# Altium footprint library LTM-2405.PcbLib: 22 footprints (part 2 of 2)
Each footprint in its own frame and in the unit in brackets; x right, y up, seen from the top. Pads: shape width x height; smd on the part's side, far side on the other; paste and mask are expansions set on the pad; w line width, h text height; cw(c..) or ccw(c..) is an arc to the next point about the centre after c.
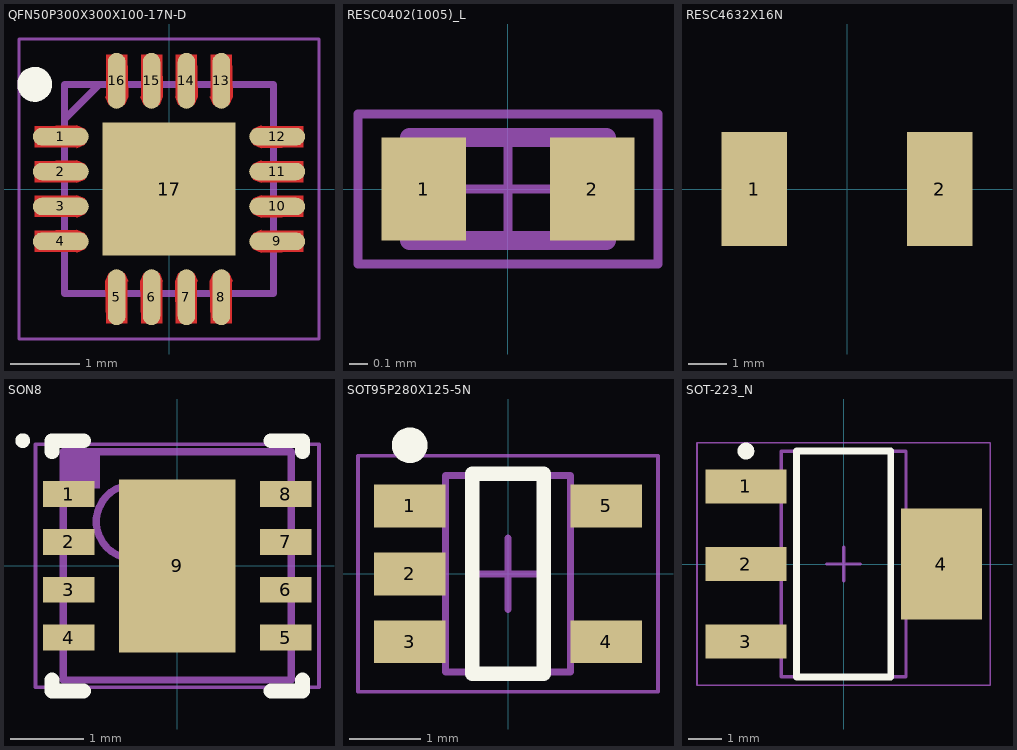
[diagram p1: the footprints below, top view; thin cyan lines are the x and y axes]

## QFN50P300X300X100-17N-D [mm]
pads (17):
  oval 0.8x0.25 smd: 1(-1.55,0.75) 2(-1.55,0.25) 3(-1.55,-0.25) 4(-1.55,-0.75) 9(1.55,-0.75) 10(1.55,-0.25) 11(1.55,0.25) 12(1.55,0.75)
  oval 0.25x0.8 smd: 5(-0.75,-1.55) 6(-0.25,-1.55) 7(0.25,-1.55) 8(0.75,-1.55) 13(0.75,1.55) 14(0.25,1.55) 15(-0.25,1.55) 16(-0.75,1.55)
  rrect0% 1.9x1.9 smd: 17(0,0)
Top Layer:
  region: -0.6,1.925 -0.588,1.325 -0.635,1.21 -0.75,1.163 -0.865,1.21 -0.912,1.325 -0.9,1.325 -0.9,1.925
  region: -0.1,1.925 -0.088,1.325 -0.135,1.21 -0.25,1.163 -0.365,1.21 -0.412,1.325 -0.4,1.325 -0.4,1.925
  region: 0.4,1.925 0.412,1.325 0.365,1.21 0.25,1.163 0.135,1.21 0.088,1.325 0.1,1.325 0.1,1.925
  region: 0.9,1.925 0.912,1.325 0.865,1.21 0.75,1.163 0.635,1.21 0.588,1.325 0.6,1.325 0.6,1.925
  region: 1.925,0.6 1.325,0.588 1.21,0.635 1.163,0.75 1.21,0.865 1.325,0.912 1.325,0.9 1.925,0.9
  region: 1.925,0.1 1.325,0.088 1.21,0.135 1.163,0.25 1.21,0.365 1.325,0.412 1.325,0.4 1.925,0.4
  region: 1.925,-0.4 1.325,-0.412 1.21,-0.365 1.163,-0.25 1.21,-0.135 1.325,-0.088 1.325,-0.1 1.925,-0.1
  region: 1.925,-0.9 1.325,-0.912 1.21,-0.865 1.163,-0.75 1.21,-0.635 1.325,-0.588 1.325,-0.6 1.925,-0.6
  region: 0.6,-1.925 0.588,-1.325 0.635,-1.21 0.75,-1.163 0.865,-1.21 0.912,-1.325 0.9,-1.325 0.9,-1.925
  region: 0.1,-1.925 0.088,-1.325 0.135,-1.21 0.25,-1.163 0.365,-1.21 0.412,-1.325 0.4,-1.325 0.4,-1.925
  region: -0.4,-1.925 -0.412,-1.325 -0.365,-1.21 -0.25,-1.163 -0.135,-1.21 -0.088,-1.325 -0.1,-1.325 -0.1,-1.925
  region: -0.9,-1.925 -0.912,-1.325 -0.865,-1.21 -0.75,-1.163 -0.635,-1.21 -0.588,-1.325 -0.6,-1.325 -0.6,-1.925
  region: -1.925,-0.6 -1.325,-0.588 -1.21,-0.635 -1.163,-0.75 -1.21,-0.865 -1.325,-0.912 -1.325,-0.9 -1.925,-0.9
  region: -1.925,-0.1 -1.325,-0.088 -1.21,-0.135 -1.163,-0.25 -1.21,-0.365 -1.325,-0.412 -1.325,-0.4 -1.925,-0.4
  region: -1.925,0.4 -1.325,0.412 -1.21,0.365 -1.163,0.25 -1.21,0.135 -1.325,0.088 -1.325,0.1 -1.925,0.1
  region: -1.925,0.9 -1.325,0.912 -1.21,0.865 -1.163,0.75 -1.21,0.635 -1.325,0.588 -1.325,0.6 -1.925,0.6
Top Overlay:
  circle w0.25: c-1.925,1.5 r0.125
Mechanical 15:
  lines w0.1: -1.5,1 -1,1.5 ; -1.5,-1.5 -1.5,1.5 1.5,1.5 1.5,-1.5 -1.5,-1.5
Mechanical 20:
  lines w0.05: -2.15,-2.15 -2.15,2.15 2.15,2.15 2.15,-2.15 -2.15,-2.15
3D body "STMPE811QTR.stp": height 1.03, standoff 0.03, extent -1.55,-1.55 1.55,1.55
3D body "STMPE811QTR.stp": height 1, standoff 0, extent -1.55,-1.55 1.55,1.55
3D body "STMPE811QTR.stp": height 1, standoff 0, extent -1.55,-1.55 1.55,1.55

## RESC0402(1005)_L [mm]
pads (2):
  rect 0.45x0.55 smd: 1(-0.45,0) 2(0.45,0)
Mechanical 13:
  lines w0.1: -0.525,-0.275 -0.525,0.275 0.525,0.275 0.525,-0.275 -0.525,-0.275
Mechanical 15:
  lines w0.05: -0.275,0 0.275,0 ; 0,-0.275 0,0.275 ; -0.8,-0.4 -0.8,0.4 0.8,0.4 0.8,-0.4 -0.8,-0.4
3D body: height 0.4, standoff 0, extent -0.525,-0.275 -0.3,0.275
3D body: height 0.4, standoff 0, extent -0.3,-0.275 0.3,0.275
3D body: height 0.4, standoff 0, extent 0.3,-0.275 0.525,0.275

## RESC4632X16N [mm]
pads (2):
  rect 1.68x2.95 smd: 1(-2.39,0) 2(2.39,0)
3D body "mf-msmf250_16x.stp": height 1.15, standoff 0, extent -2.3,-1.62 2.3,1.62

## SON8 [mm]
pads (9):
  rect 0.7x0.35 smd: 1(-1.475,0.975) 2(-1.475,0.325) 3(-1.475,-0.325) 4(-1.475,-0.975) 5(1.475,-0.975) 6(1.475,-0.325) 7(1.475,0.325) 8(1.475,0.975)
  rect 1.58x2.35 smd: 9(0,0)
Top Overlay:
  circle w0.1: c-2.099,1.699 r0.05
  lines w0.2: -1.7,-1.55 -1.7,-1.7 -1.274,-1.7 ; -1.7,1.55 -1.7,1.7 -1.274,1.7 ; 1.274,-1.7 1.7,-1.7 1.7,-1.55 ; 1.274,1.7 1.7,1.7 1.7,1.55
Mechanical 13:
  circle w0.1: c-0.6,0.6 r0.5
  lines w0.1: -1.55,-1.55 1.55,-1.55 1.55,1.55 -1.55,1.55 -1.55,-1.55
Mechanical 15:
  lines w0.05: -1.925,-1.65 -1.925,1.65 1.925,1.65 1.925,-1.65 -1.925,-1.65
  lines w0.1: -0.5,0 0.5,0 ; 0,-0.5 0,0.5
Mechanical 29:
  rectangle: -1.55,1.05 -1.05,1.55
  lines w0.05: -1.55,-1.55 -1.55,1.55 1.55,1.55 1.55,-1.55 -1.55,-1.55
3D body: height 0.8, standoff 0, extent -1.55,-1.55 1.55,1.55

## SOT95P280X125-5N [mm]
pads (5):
  rect 1x0.6 smd: 1(-1.375,0.95) 2(-1.375,0) 3(-1.375,-0.95) 4(1.375,-0.95) 5(1.375,0.95)
Top Overlay:
  circle w0.25: c-1.375,1.8 r0.125
  lines w0.2: -0.5,-1.4 -0.5,1.4 0.5,1.4 0.5,-1.4 -0.5,-1.4
Mechanical 13:
  lines w0.1: -0.875,-1.375 0.875,-1.375 0.875,1.375 -0.875,1.375 -0.875,-1.375
Mechanical 15:
  lines w0.05: -2.1,-1.65 2.1,-1.65 2.1,1.65 -2.1,1.65 -2.1,-1.65
  lines w0.1: -0.5,0 0.5,0 ; 0,-0.5 0,0.5
3D body: height 1.25, standoff 0.1, extent -0.875,-1.375 0.875,1.375

## SOT-223_N [mm]
pads (4):
  rect 2.4x1 smd: 1(-2.9,2.3) 2(-2.9,0) 3(-2.9,-2.3)
  rect 2.4x3.3 smd: 4(2.9,0)
Top Overlay:
  circle w0.25: c-2.9,3.35 r0.125
  lines w0.2: -1.4,-3.35 -1.4,3.35 1.4,3.35 1.4,-3.35 -1.4,-3.35
Mechanical 13:
  lines w0.1: -1.85,-3.35 -1.85,3.35 1.85,3.35 1.85,-3.35 -1.85,-3.35
Mechanical 15:
  lines w0.05: -4.35,-3.6 -4.35,3.6 4.35,3.6 4.35,-3.6 -4.35,-3.6
  lines w0.1: -0.5,0 0.5,0 ; 0,-0.5 0,0.5
3D body: height 1.8, standoff 0.02, extent -1.85,-3.35 1.85,3.35